# Altium schematic symbol library AD_Lib.SchLib: 1239 symbols (part 6 of 9) (continued)
## Q_PZTA44,115
designator Q?, comment PZTA44
Èý¼«¹Ü,NPN,0.3A,400V; Manufacturer: NXP; pro-environment: RoHS; Quality: -65~125¡æ; SN: 03.4.22.17.51TA4401S; OPN: PZTA44,115; PadsNum: 0; Value: NPN,0.3A,400V; Part: PZTA44; Category: Èý¼«¹Ü; QTY: 1000; Price: ?; OPN_JLC: OPN_JLC; SN_JLC: SN_JLC; Price_JLC: 0
footprint SOT223-4 (SOT223, 4-Leads, Body 6.5x3.5mm, Pitch 2.3mm, Lead Span 7mm, IPC Low Density)
pins: 1 B, 2 C, 3 E, 4 C

## Q_PZTA64
designator Q?, comment PZTA64
Èý¼«¹Ü,PNP,1.2A,30V; Manufacturer: Fairchild; pro-environment: RoHS; Quality: -55~150¡æ; PadsNum: 0; SN: SN; Value: PNP,1.2A,30V; OPN: PZTA64; Part: PZTA64; Category: Èý¼«¹Ü; QTY: 4000; Price: 0.79439; OPN_JLC: OPN_JLC; SN_JLC: SN_JLC; Price_JLC: 0
footprint SOT223-4 (SOT223, 4-Leads, Body 6.5x3.5mm, Pitch 2.3mm, Lead Span 7mm, IPC Low Density)
pins: 1 B, 2 C, 3 E, 4 C

## Q_PZTA92
designator Q?, comment PZTA92
Èý¼«¹Ü,PNP,0.5A,300V; Manufacturer: Fairchild; pro-environment: RoHS; Quality: -55~150¡æ; SN: 03.4.22.11.31PZTA01S; PadsNum: 0; Value: PNP,0.5A,300V; OPN: PZTA92; Part: PZTA92; Category: Èý¼«¹Ü; Price: ?; OPN_JLC: OPN_JLC; SN_JLC: SN_JLC; Price_JLC: 0
footprint SOT223-4 (SOT223, 4-Leads, Body 6.5x3.5mm, Pitch 2.3mm, Lead Span 7mm, IPC Low Density)
pins: 1 B, 2 C, 3 E, 4 C

## Q_SEMiX303GB12E4s
designator Q?, comment SEMiX303GB12E4s
IGBT; Manufacturer: SEMIKRON; pro-environment: RoHS; Quality: -40~175¡æ; Value: IGBT,1200V,359A; other: IGBT;Half bridge;1200V,359A; PadsNum: 0; SN: SN; OPN: SEMiX303GB12E4s; Part: SEMiX303GB12E4s; Category: Èý¼«¹Ü; QTY: 1; Price: -; OPN_JLC: OPN_JLC; SN_JLC: SN_JLC; Price_JLC: 0
footprint J_SEMiX303GB12E4s (Semikron°ëÇÅÄ£¿é)
part A pins: 2 C1, 3 E1, 7 E1, 8 B1, 11 E1, 12 B1, 15 E1, 16 B1, 18 C1
part B pins: 1 E2, 4 C2, 5 E2, 6 B2, 9 E2, 10 B2, 13 E2, 14 B2
part C pins: 19, 20
part C text: T

## Q_SI2323DS-T1-GE3
designator Q?, comment SI2323DS
MOS; PE; 4.7A; 20V; Manufacturer: Vishay; pro-environment: RoHS; Quality: -55~150¡æ; Value: PE,4.7A,20V; OPN: SI2323DS-T1-GE3; PadsNum: 0; SN: SN; Part: SI2323DS; Category: MOS¹Ü; QTY: 3000; Price: 2.3166; OPN_JLC: OPN_JLC; SN_JLC: SN_JLC; Price_JLC: 0
footprint SOT23-3 (SOT-23; 3 Leads; Body 3.0 x 2.5 mm, inc. leads (LxW max))
pins: 1 G, 2 S, 3 D
text: PE

## Q_SUD50P04-09L-E3
designator Q?, comment SUD50P04-09L
MOS; PE; 50A; 40V; Manufacturer: Vishay; pro-environment: RoHS; Quality: -55~175¡æ; SN: 03.4.24.21.33SUD501S; Value: PE,50A,40V; OPN: SUD50P04-09L-E3; PadsNum: 0; Category: MOS¹Ü; Part: SUD50P04-09L; QTY: 2000; Price: 7.4412; OPN_JLC: OPN_JLC; SN_JLC: SN_JLC; Price_JLC: 0
footprint TO252-3 (D-PAK, 4-Leads, Body 6.1x6.5mm, Pitch 2.28mm, Lead Span 9.8mm, IPC Low Density)
pins: 1 G, 3 S, 4 D
text: PE

## Q_TK8A50D(STA4,Q,M)
designator Q?, comment TK8A50D
MOS¹Ü;NE; Manufacturer: Toshiba; pro-environment: RoHS; Quality: -55~150¡æ; SN: 03.4.24.21.72TK8A01S; Value: NE,8A,500V; OPN: TK8A50D(STA4,Q,M); PadsNum: 0; Part: TK8A50D; Category: MOS¹Ü; QTY: 2500; Price: 4.9491; OPN_JLC: OPN_JLC; SN_JLC: SN_JLC; Price_JLC: 0
footprint TO220-3 (TO, Thru-Hole, Vertical, Heatsink Mounted; 3 In-Line Leads; Pitch 2.54 mm)
pins: 1 G, 2 D, 3 S
text: NE

## Q_TN2540N8-G
designator Q?, comment TN2540
MOS¹Ü£¬NE; Manufacturer: Microchip; pro-environment: RoHS; Quality: -55~150¡æ; SN: 03.4.24.21.53TN2501S; Value: NE,1A,400V; OPN: TN2540N8-G; PadsNum: 0; Part: TN2540; Category: MOS¹Ü; QTY: 2000; Price: ?; OPN_JLC: OPN_JLC; SN_JLC: SN_JLC; Price_JLC: 0
footprint SOT89-3 (SOT89, 3-Leads, Body 4.5x2.4 mm, Pitch 1.5mm, Lead Span 4.1mm, IPC Medium Density)
pins: 1 G, 2 D, 3 S
text: NE

## Q_TP2540N8-G
designator Q?, comment TP2540
MOS¹Ü£¬PE; Manufacturer: Microchip; pro-environment: RoHS; Quality: -55~150¡æ; SN: 03.4.24.21.53TP2501s; Value: PE,0.4A,400V; OPN: TP2540N8-G; PadsNum: 0; Part: TP2540; Category: MOS¹Ü; QTY: 2000; Price: ?; OPN_JLC: OPN_JLC; SN_JLC: SN_JLC; Price_JLC: 0
footprint SOT89-3 (SOT89, 3-Leads, Body 4.5x2.4 mm, Pitch 1.5mm, Lead Span 4.1mm, IPC Medium Density)
pins: 1 G, 2 D, 3 S
text: PE

## Q_TTD1409B
designator Q?, comment TTD1409B
´ïÁÖ¶Ù¹Ü£¬NPN; Manufacturer: TOSHIBA; Quality: -55~150¡æ; SN: 03.4.22.11.38140902S; Value: 6A,400V; PadsNum: 0; OPN: TTD1409B; Part: TTD1409B; Category: ´ïÁÖ¶Ù¹Ü; QTY: 1000; Price: ?; OPN_JLC: OPN_JLC; SN_JLC: SN_JLC; Price_JLC: 0
footprint TO220-3 (TO, Thru-Hole, Vertical, Heatsink Mounted; 3 In-Line Leads; Pitch 2.54 mm)
pins: 1 B, 2 C, 3 E

## Q_VP2450N3-G
designator Q?, comment VP2450
MOS¹Ü£¬PE; Manufacturer: Microchip; pro-environment: RoHS; Quality: -55~150¡æ; Value: PE,0.1A,500V; OPN: VP2450N3-G; PadsNum: 0; SN: SN; Part: VP2450; Category: MOS¹Ü; QTY: 1000; Price: ?; OPN_JLC: OPN_JLC; SN_JLC: SN_JLC; Price_JLC: 0
footprint SOT89-3 (SOT89, 3-Leads, Body 4.5x2.4 mm, Pitch 1.5mm, Lead Span 4.1mm, IPC Medium Density)
pins: 1 G, 2 D, 3 S
text: PE

## R0402_0/1kV
designator R?, comment 0¦¸
ÌùÆ¬µç×è; Manufacturer: KOA; pro-environment: RoHS; Quality: -55~155¡æ; OPN: RK73Z1ELTP; PadsNum: 2; SN: SN; other: 0¦¸; Category: µç×è; Part: RK73Z1ELTP; Value: 0¦¸; QTY: 10000; Price: 0.09944; OPN_JLC: OPN_JLC; SN_JLC: SN_JLC; Price_JLC: 0
footprint R0402 (ÌùÆ¬µç×è£¬¹¦ÂÊ1/24W)
pins: 1, 2

## R0402_1.5K/50V
designator R?, comment 1.5k¦¸,0.1W
ÌùÆ¬µç×è; Manufacturer: KOA; pro-environment: RoHS; Quality: -55~155¡æ; other: 1.5k¦¸;0.1W;1%; OPN: RK73H1ETTP1501F; PadsNum: 2; SN: SN; Category: µç×è; Part: RK73H1ETTP1501F; Value: 1.5k¦¸,0.1W; QTY: 10000; Price: 0.03051; OPN_JLC: OPN_JLC; SN_JLC: SN_JLC; Price_JLC: 0
footprint R0402 (ÌùÆ¬µç×è£¬¹¦ÂÊ1/24W)
pins: 1, 2

## R0402_1M/50V
designator R?, comment 1M¦¸,0.1W
ÌùÆ¬µç×è; Manufacturer: KOA; pro-environment: RoHS; Quality: -55~155¡æ; other: 1M¦¸;0.1W;1%; OPN: RK73H1ETTP1004F; PadsNum: 2; SN: SN; Category: µç×è; Part: RK73H1ETTP1004F; Value: 1M¦¸,0.1W; QTY: 10000; Price: 0.03051; OPN_JLC: OPN_JLC; SN_JLC: SN_JLC; Price_JLC: 0
footprint R0402 (ÌùÆ¬µç×è£¬¹¦ÂÊ1/24W)
pins: 1, 2

## R0402_2.49K/50V
designator R?, comment 2.49k¦¸,0.1W
ÌùÆ¬µç×è; Manufacturer: KOA; pro-environment: RoHS; Quality: -55~155¡æ; other: 2.49k¦¸;0.1W;1%; OPN: RK73H1ETTP2491F; PadsNum: 2; SN: SN; Category: µç×è; Part: RK73H1ETTP2491F; Value: 2.49k¦¸,0.1W; QTY: 10000; Price: 0.03051; OPN_JLC: OPN_JLC; SN_JLC: SN_JLC; Price_JLC: 0
footprint R0402 (ÌùÆ¬µç×è£¬¹¦ÂÊ1/24W)
pins: 1, 2

## R0402_3.92K/50V
designator R?, comment 3.92k¦¸,0.1W
ÌùÆ¬µç×è; Manufacturer: KOA; pro-environment: RoHS; Quality: -55~155¡æ; other: 3.92k¦¸;0.1W;1%; OPN: RK73H1ETTP3921F; PadsNum: 2; SN: SN; Category: µç×è; Part: RK73H1ETTP3921F; Value: 3.92k¦¸,0.1W; QTY: 10000; Price: 0.03051; OPN_JLC: OPN_JLC; SN_JLC: SN_JLC; Price_JLC: 0
footprint R0402 (ÌùÆ¬µç×è£¬¹¦ÂÊ1/24W)
pins: 1, 2

## R0402_4.7K/50V
designator R?, comment 4.7k¦¸,0.1W
ÌùÆ¬µç×è; Manufacturer: KOA; pro-environment: RoHS; Quality: -55~155¡æ; other: 4.7k¦¸;0.1W;1%; OPN: RK73H1ETTP4701F; PadsNum: 2; SN: SN; Category: µç×è; Part: RK73H1ETTP4701F; Value: 4.7k¦¸,0.1W; QTY: 10000; Price: 0.03051; OPN_JLC: OPN_JLC; SN_JLC: SN_JLC; Price_JLC: 0
footprint R0402 (ÌùÆ¬µç×è£¬¹¦ÂÊ1/24W)
pins: 1, 2

## R0402_10K/50V
designator R?, comment 10k¦¸,0.1W
ÌùÆ¬µç×è; Manufacturer: KOA; pro-environment: RoHS; Quality: -55~155¡æ; other: 10k¦¸;0.1W;1%; OPN: RK73H1ETTP1002F; PadsNum: 2; SN: SN; Category: µç×è; Part: RK73H1ETTP1002F; Value: 10k¦¸,0.1W; QTY: 10000; Price: 0.03051; OPN_JLC: OPN_JLC; SN_JLC: SN_JLC; Price_JLC: 0
footprint R0402 (ÌùÆ¬µç×è£¬¹¦ÂÊ1/24W)
pins: 1, 2

## R0402_10K/50V_1
designator R32, comment NC
ÌùÆ¬µç×è; Manufacturer: KOA; pro-environment: RoHS; Quality: -55~155¡æ; other: 10k¦¸;0.1W;1%; OPN: RK73H1ETTP1002F; SN: SN; Category: µç×è; Part: RK73H1ETTP1002F; Value: NC; QTY: 10000; Price: 0.03051; OPN_JLC: OPN_JLC; SN_JLC: SN_JLC
footprint 0402A
pins: 1, 2

## R0402_10K/50V_2
designator R36, comment NC
ÌùÆ¬µç×è; Manufacturer: KOA; pro-environment: RoHS; Quality: -55~155¡æ; other: 10k¦¸;0.1W;1%; OPN: RK73H1ETTP1002F; SN: SN; Category: µç×è; Part: RK73H1ETTP1002F; Value: NC; QTY: 10000; Price: 0.03051; OPN_JLC: OPN_JLC; SN_JLC: SN_JLC
footprint 0402A
pins: 1, 2

## R0402_10K/50V_3
designator R38, comment NC
ÌùÆ¬µç×è; Manufacturer: KOA; pro-environment: RoHS; Quality: -55~155¡æ; other: 10k¦¸;0.1W;1%; OPN: RK73H1ETTP1002F; SN: SN; Category: µç×è; Part: RK73H1ETTP1002F; Value: NC; QTY: 10000; Price: 0.03051; OPN_JLC: OPN_JLC; SN_JLC: SN_JLC
footprint 0402A
pins: 1, 2

## R0402_10K/50V_4
designator R43, comment NC
ÌùÆ¬µç×è; Manufacturer: KOA; pro-environment: RoHS; Quality: -55~155¡æ; other: 10k¦¸;0.1W;1%; OPN: RK73H1ETTP1002F; SN: SN; Category: µç×è; Part: RK73H1ETTP1002F; Value: NC; QTY: 10000; Price: 0.03051; OPN_JLC: OPN_JLC; SN_JLC: SN_JLC
footprint 0402A
pins: 1, 2

## R0402_10K/50V_5
designator R32, comment NC
ÌùÆ¬µç×è; Manufacturer: KOA; pro-environment: RoHS; Quality: -55~155¡æ; other: 10k¦¸;0.1W;1%; OPN: RK73H1ETTP1002F; SN: SN; Category: µç×è; Part: RK73H1ETTP1002F; Value: NC; QTY: 10000; Price: 0.03051; OPN_JLC: OPN_JLC; SN_JLC: SN_JLC
footprint 0402A
pins: 1, 2

## R0402_10K/50V_6
designator R36, comment NC
ÌùÆ¬µç×è; Manufacturer: KOA; pro-environment: RoHS; Quality: -55~155¡æ; other: 10k¦¸;0.1W;1%; OPN: RK73H1ETTP1002F; SN: SN; Category: µç×è; Part: RK73H1ETTP1002F; Value: NC; QTY: 10000; Price: 0.03051; OPN_JLC: OPN_JLC; SN_JLC: SN_JLC
footprint 0402A
pins: 1, 2

## R0402_10K/50V_7
designator R38, comment NC
ÌùÆ¬µç×è; Manufacturer: KOA; pro-environment: RoHS; Quality: -55~155¡æ; other: 10k¦¸;0.1W;1%; OPN: RK73H1ETTP1002F; SN: SN; Category: µç×è; Part: RK73H1ETTP1002F; Value: NC; QTY: 10000; Price: 0.03051; OPN_JLC: OPN_JLC; SN_JLC: SN_JLC
footprint 0402A
pins: 1, 2

## R0402_10K/50V_8
designator R43, comment NC
ÌùÆ¬µç×è; Manufacturer: KOA; pro-environment: RoHS; Quality: -55~155¡æ; other: 10k¦¸;0.1W;1%; OPN: RK73H1ETTP1002F; SN: SN; Category: µç×è; Part: RK73H1ETTP1002F; Value: NC; QTY: 10000; Price: 0.03051; OPN_JLC: OPN_JLC; SN_JLC: SN_JLC
footprint 0402A
pins: 1, 2

## R0402_13/50V
designator R?, comment 13¦¸,0.1W
ÌùÆ¬µç×è; Manufacturer: KOA; pro-environment: RoHS; Quality: -55~155¡æ; other: 13¦¸;0.1W;1%; OPN: RK73H1ETTP13R0F; PadsNum: 2; SN: SN; Category: µç×è; Part: RK73H1ETTP13R0F; Value: 13¦¸,0.1W; QTY: 10000; Price: 0.03051; OPN_JLC: OPN_JLC; SN_JLC: SN_JLC; Price_JLC: 0
footprint R0402 (ÌùÆ¬µç×è£¬¹¦ÂÊ1/24W)
pins: 1, 2

## R0402_15K/50V
designator R?, comment 15k¦¸,0.1W
ÌùÆ¬µç×è; Manufacturer: KOA; pro-environment: RoHS; Quality: -55~155¡æ; other: 15k¦¸;0.1W;1%; OPN: RK73H1ETTP1502F; PadsNum: 2; SN: SN; Category: µç×è; Part: RK73H1ETTP1502F; Value: 15k¦¸,0.1W; QTY: 10000; Price: 0.03051; OPN_JLC: OPN_JLC; SN_JLC: SN_JLC; Price_JLC: 0
footprint R0402 (ÌùÆ¬µç×è£¬¹¦ÂÊ1/24W)
pins: 1, 2

## R0402_26.1K/50V
designator R?, comment 26.1k¦¸,0.1W
ÌùÆ¬µç×è; Manufacturer: KOA; pro-environment: RoHS; Quality: -55~155¡æ; other: 26.1k¦¸;0.1W;1%; OPN: RK73H1ETTP2612F; PadsNum: 2; SN: SN; Category: µç×è; Part: RK73H1ETTP2612F; Value: 26.1k¦¸,0.1W; QTY: 10000; Price: 0.03051; OPN_JLC: OPN_JLC; SN_JLC: SN_JLC; Price_JLC: 0
footprint R0402 (ÌùÆ¬µç×è£¬¹¦ÂÊ1/24W)
pins: 1, 2

## R0402_47K/50V
designator R?, comment 47k¦¸,0.1W
ÌùÆ¬µç×è; Manufacturer: KOA; pro-environment: RoHS; Quality: -55~155¡æ; other: 47k¦¸;0.1W;1%; OPN: RK73H1ETTP4702F; PadsNum: 2; SN: SN; Category: µç×è; Part: RK73H1ETTP4702F; Value: 47k¦¸,0.1W; QTY: 10000; Price: 0.03051; OPN_JLC: OPN_JLC; SN_JLC: SN_JLC; Price_JLC: 0
footprint R0402 (ÌùÆ¬µç×è£¬¹¦ÂÊ1/24W)
pins: 1, 2

## R0402_56.2/50V
designator R?, comment 56.2¦¸,0.1W
ÌùÆ¬µç×è; Manufacturer: KOA; pro-environment: RoHS; Quality: -55~155¡æ; other: 56.2¦¸;0.1W;1%; OPN: RK73H1ETTP56R2F; PadsNum: 2; SN: SN; Category: µç×è; Part: RK73H1ETTP56R2F; Value: 56.2¦¸,0.1W; QTY: 10000; Price: 0.03051; OPN_JLC: OPN_JLC; SN_JLC: SN_JLC; Price_JLC: 0
footprint R0402 (ÌùÆ¬µç×è£¬¹¦ÂÊ1/24W)
pins: 1, 2

## R0402_95.3K/50V
designator R?, comment 95.3k¦¸,0.1W
ÌùÆ¬µç×è; Manufacturer: KOA; pro-environment: RoHS; Quality: -55~155¡æ; other: 95.3k¦¸;0.1W;1%; OPN: RK73H1ETTP9532F; PadsNum: 2; SN: SN; Category: µç×è; Part: RK73H1ETTP9532F; Value: 95.3k¦¸,0.1W; QTY: 10000; Price: 0.03051; OPN_JLC: OPN_JLC; SN_JLC: SN_JLC; Price_JLC: 0
footprint R0402 (ÌùÆ¬µç×è£¬¹¦ÂÊ1/24W)
pins: 1, 2

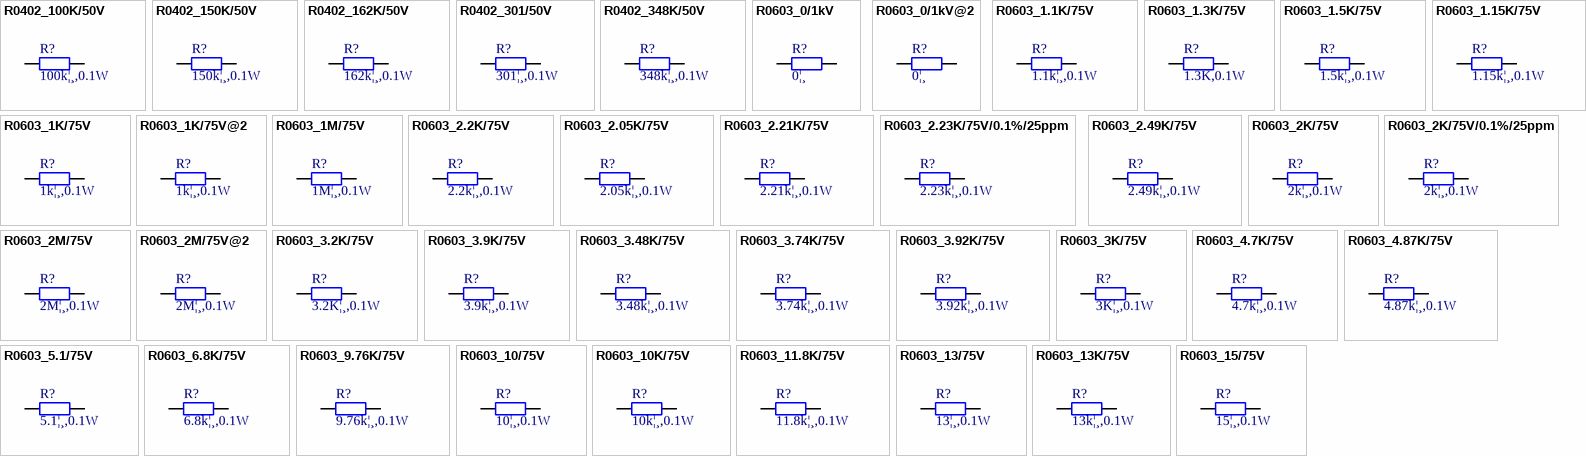
[diagram p29: symbols R0402_100K/50V to R0603_15/75V]

## R0402_100K/50V
designator R?, comment 100k¦¸,0.1W
ÌùÆ¬µç×è; Manufacturer: KOA; pro-environment: RoHS; Quality: -55~155¡æ; other: 100k¦¸;0.1W;1%; OPN: RK73H1ETTP1003F; PadsNum: 2; SN: SN; Category: µç×è; Part: RK73H1ETTP1003F; Value: 100k¦¸,0.1W; QTY: 10000; Price: 0.03051; OPN_JLC: OPN_JLC; SN_JLC: SN_JLC; Price_JLC: 0
footprint R0402 (ÌùÆ¬µç×è£¬¹¦ÂÊ1/24W)
pins: 1, 2

## R0402_150K/50V
designator R?, comment 150k¦¸,0.1W
ÌùÆ¬µç×è; Manufacturer: KOA; pro-environment: RoHS; Quality: -55~155¡æ; other: 150k¦¸;0.1W;1%; OPN: RK73H1ETTP1503F; PadsNum: 2; SN: SN; Category: µç×è; Part: RK73H1ETTP1503F; Value: 150k¦¸,0.1W; QTY: 10000; Price: 0.03051; OPN_JLC: OPN_JLC; SN_JLC: SN_JLC; Price_JLC: 0
footprint R0402 (ÌùÆ¬µç×è£¬¹¦ÂÊ1/24W)
pins: 1, 2

## R0402_162K/50V
designator R?, comment 162k¦¸,0.1W
ÌùÆ¬µç×è; Manufacturer: KOA; pro-environment: RoHS; Quality: -55~155¡æ; other: 162k¦¸;0.1W;1%; OPN: RK73H1ETTP1623F; PadsNum: 2; SN: SN; Category: µç×è; Part: RK73H1ETTP1623F; Value: 162k¦¸,0.1W; QTY: 10000; Price: 0.03051; OPN_JLC: OPN_JLC; SN_JLC: SN_JLC; Price_JLC: 0
footprint R0402 (ÌùÆ¬µç×è£¬¹¦ÂÊ1/24W)
pins: 1, 2

## R0402_301/50V
designator R?, comment 301¦¸,0.1W
ÌùÆ¬µç×è; Manufacturer: KOA; pro-environment: RoHS; Quality: -55~155¡æ; other: 301¦¸;0.1W;1%; OPN: RK73H1ETTP3010F; PadsNum: 2; SN: SN; Category: µç×è; Part: RK73H1ETTP3010F; Value: 301¦¸,0.1W; QTY: 10000; Price: 0.03051; OPN_JLC: OPN_JLC; SN_JLC: SN_JLC; Price_JLC: 0
footprint R0402 (ÌùÆ¬µç×è£¬¹¦ÂÊ1/24W)
pins: 1, 2

## R0402_348K/50V
designator R?, comment 348k¦¸,0.1W
ÌùÆ¬µç×è; Manufacturer: KOA; pro-environment: RoHS; Quality: -55~155¡æ; other: 348k¦¸;0.1W;1%; OPN: RK73H1ETTP3483F; PadsNum: 2; SN: SN; Category: µç×è; Part: RK73H1ETTP3483F; Value: 348k¦¸,0.1W; QTY: 10000; Price: 0.03051; OPN_JLC: OPN_JLC; SN_JLC: SN_JLC; Price_JLC: 0
footprint R0402 (ÌùÆ¬µç×è£¬¹¦ÂÊ1/24W)
pins: 1, 2

## R0603_0/1kV
designator R?, comment 0¦¸
ÌùÆ¬µç×è; Manufacturer: KOA; pro-environment: RoHS; Quality: -55~155¡æ; SN: 03.4.38.11.16000001S; OPN: RK73Z1JTTD; PadsNum: 2; other: 0¦¸; Category: µç×è; Part: RK73Z1JTTD; Value: 0¦¸; QTY: 5000; Price: ?; OPN_JLC: 0603WAF0000T5E; SN_JLC: C21189; Price_JLC: 0
footprint R0603 (ÌùÆ¬µç×è£¬¹¦ÂÊ1/10W)
pins: 1, 2

## R0603_0/1kV@2
designator R?, comment 0¦¸
ÌùÆ¬µç×è; Manufacturer: Panasonic; pro-environment: RoHS; Quality: -55~155¡æ; OPN: ERJ-3GEY0R00V; PadsNum: 2; SN: SN; other: 0¦¸; Category: µç×è; Part: ERJ-3GEY0R00V; Value: 0¦¸; Price: ?; OPN_JLC: 0603WAF0000T5E; SN_JLC: C21189; Price_JLC: 0
footprint R0603 (ÌùÆ¬µç×è£¬¹¦ÂÊ1/10W)
pins: 1, 2

## R0603_1.1K/75V
designator R?, comment 1.1k¦¸,0.1W
ÌùÆ¬µç×è; Manufacturer: KOA; pro-environment: RoHS; Quality: -55~155¡æ; SN: 03.4.38.11.16011201S; other: 1.1k¦¸,0.1W,1%,75V; OPN: RK73H1JTTD1101F; PadsNum: 2; Category: µç×è; Part: RK73H1JTTD1101F; Value: 1.1k¦¸,0.1W; Price: ?; OPN_JLC: 0603WAF1101T5E; SN_JLC: C22764; Price_JLC: 0
footprint R0603 (ÌùÆ¬µç×è£¬¹¦ÂÊ1/10W)
pins: 1, 2

## R0603_1.3K/75V
designator R?, comment 1.3K,0.1W
ÌùÆ¬µç×è; Manufacturer: KOA; pro-environment: RoHS; Quality: -55~155¡æ; other: 1.3K,0.1W,1%,75V; OPN: RK73H1JTTD1301F; PadsNum: 2; SN: SN; Category: µç×è; Part: RK73H1JTTD1301F; Value: 1.3K,0.1W; QTY: 5000; OPN_JLC: OPN_JLC; SN_JLC: SN_JLC; Price_JLC: 0
footprint R0603 (ÌùÆ¬µç×è£¬¹¦ÂÊ1/10W)
pins: 1, 2

## R0603_1.5K/75V
designator R?, comment 1.5k¦¸,0.1W
ÌùÆ¬µç×è; Manufacturer: KOA; pro-environment: RoHS; Quality: -55~155¡æ; SN: 03.4.38.11.16015202S; other: 1.5k¦¸,0.1W,1%,75V; OPN: RK73H1JTTD1501F; PadsNum: 2; Category: µç×è; Part: RK73H1JTTD1501F; Value: 1.5k¦¸,0.1W; QTY: 5000; Price: 0.0234; OPN_JLC: 0603WAF1501T5E; SN_JLC: C22843; Price_JLC: 0
footprint R0603 (ÌùÆ¬µç×è£¬¹¦ÂÊ1/10W)
pins: 1, 2

## R0603_1.15K/75V
designator R?, comment 1.15k¦¸,0.1W
ÌùÆ¬µç×è; Manufacturer: KOA; pro-environment: RoHS; Quality: -55~155¡æ; other: 1.15k¦¸,0.1W,1%,75V; OPN: RK73H1JTTD1151F; PadsNum: 2; SN: SN; Category: µç×è; Part: RK73H1JTTD1151F; Value: 1.15k¦¸,0.1W; QTY: 5000; Price: 0.0234; OPN_JLC: OPN_JLC; SN_JLC: SN_JLC; Price_JLC: 0
footprint R0603 (ÌùÆ¬µç×è£¬¹¦ÂÊ1/10W)
pins: 1, 2

## R0603_1K/75V
designator R?, comment 1k¦¸,0.1W
ÌùÆ¬µç×è; Manufacturer: KOA; pro-environment: RoHS; Quality: -55~155¡æ; SN: 03.4.38.11.16010203S; other: 1k¦¸,0.1W,1%,75V; OPN: RK73H1JTTD1001F; PadsNum: 2; Category: µç×è; Part: RK73H1JTTD1001F; Value: 1k¦¸,0.1W; QTY: 5000; Price: ?; OPN_JLC: 0603WAF1001T5E; SN_JLC: C21190; Price_JLC: 0
footprint R0603 (ÌùÆ¬µç×è£¬¹¦ÂÊ1/10W)
pins: 1, 2

## R0603_1K/75V@2
designator R?, comment 1k¦¸,0.1W
ÌùÆ¬µç×è; Manufacturer: Panasonic; pro-environment: RoHS; Quality: -55~155¡æ; SN: 03.4.38.11.16010201S; other: 1k¦¸,0.1W,1%,75V; OPN: ERJ3GEYJ102V; PadsNum: 2; Category: µç×è; Part: ERJ3GEYJ102V; Value: 1k¦¸,0.1W; Price: ?; OPN_JLC: 0603WAF1001T5E; SN_JLC: C21190; Price_JLC: 0
footprint R0603 (ÌùÆ¬µç×è£¬¹¦ÂÊ1/10W)
pins: 1, 2

## R0603_1M/75V
designator R?, comment 1M¦¸,0.1W
ÌùÆ¬µç×è; Manufacturer: Yageo; pro-environment: RoHS; Quality: -55~155¡æ; SN: 03.4.38.11.16010501S; other: 1M¦¸,0.1W,1%,75V; OPN: RC0603FR-071ML; PadsNum: 2; Category: µç×è; Part: RC0603FR-071ML; Value: 1M¦¸,0.1W; QTY: 5000; Price: ?; OPN_JLC: 0603WAF1004T5E; SN_JLC: C22935; Price_JLC: 0
footprint R0603 (ÌùÆ¬µç×è£¬¹¦ÂÊ1/10W)
pins: 1, 2

## R0603_2.2K/75V
designator R?, comment 2.2k¦¸,0.1W
ÌùÆ¬µç×è; Manufacturer: KOA; pro-environment: RoHS; Quality: -55~155¡æ; other: 2.2k¦¸,0.1W,1%,75V; OPN: RK73H1JTTD2201F; PadsNum: 2; SN: SN; Category: µç×è; Part: RK73H1JTTD2201F; Value: 2.2k¦¸,0.1W; QTY: 5000; Price: -; OPN_JLC: RC0603FR-072K2L; SN_JLC: C114662; Price_JLC: 0.009713
footprint R0603 (ÌùÆ¬µç×è£¬¹¦ÂÊ1/10W)
pins: 1, 2

## R0603_2.05K/75V
designator R?, comment 2.05k¦¸,0.1W
ÌùÆ¬µç×è; Manufacturer: KOA; pro-environment: RoHS; Quality: -55~155¡æ; other: 2.05k¦¸,0.1W,1%,75V; OPN: RK73H1JTTD2051F; PadsNum: 2; SN: SN; Category: µç×è; Part: RK73H1JTTD2051F; Value: 2.05k¦¸,0.1W; Price: ?; OPN_JLC: OPN_JLC; SN_JLC: SN_JLC; Price_JLC: 0
footprint R0603 (ÌùÆ¬µç×è£¬¹¦ÂÊ1/10W)
pins: 1, 2

## R0603_2.21K/75V
designator R?, comment 2.21k¦¸,0.1W
ÌùÆ¬µç×è; Manufacturer: KOA; pro-environment: RoHS; Quality: -55~155¡æ; other: 2.21k¦¸,0.1W,1%,75V; OPN: RK73H2ATTD2211F; PadsNum: 2; SN: SN; Category: µç×è; Part: RK73H2ATTD2211F; Value: 2.21k¦¸,0.1W; Price: ?; OPN_JLC: OPN_JLC; SN_JLC: SN_JLC; Price_JLC: 0
footprint R0603 (ÌùÆ¬µç×è£¬¹¦ÂÊ1/10W)
pins: 1, 2

## R0603_2.23K/75V/0.1%/25ppm
designator R?, comment 2.23k¦¸,0.1W
¾«ÃÜµç×è£¬0.1%£¬25ppm; Manufacturer: KOA; pro-environment: RoHS; Quality: -55~155¡æ; other: 2.23k¦¸,0.1W,0.1%,75V,25ppm; OPN: RN73H1JTTD2231B25; PadsNum: 2; SN: SN; Category: µç×è; Part: RN73H1JTTD2231B25; Value: 2.23k¦¸,0.1W; QTY: 5000; Price: 1.9656; OPN_JLC: OPN_JLC; SN_JLC: SN_JLC; Price_JLC: 0
footprint R0603 (ÌùÆ¬µç×è£¬¹¦ÂÊ1/10W)
pins: 1, 2

## R0603_2.49K/75V
designator R?, comment 2.49k¦¸,0.1W
ÌùÆ¬µç×è; Manufacturer: Yageo; pro-environment: RoHS; Quality: -55~155¡æ; other: 2.49k¦¸,0.1W,1%,75V; OPN: RC0603FR-0749K9L; PadsNum: 2; SN: SN; Category: µç×è; Part: RC0603FR-0749K9L; Value: 2.49k¦¸,0.1W; QTY: 5000; Price: 0.006069; OPN_JLC: RC0603FR-0749K9L; SN_JLC: C114624; Price_JLC: 0.006069
footprint R0603 (ÌùÆ¬µç×è£¬¹¦ÂÊ1/10W)
pins: 1, 2

## R0603_2K/75V
designator R?, comment 2k¦¸,0.1W
ÌùÆ¬µç×è; Manufacturer: KOA; pro-environment: RoHS; Quality: -55~155¡æ; SN: 03.4.38.11.16020203S; other: 2k¦¸,0.1W,1%,50V; OPN: RK73H1JTTD2001F; PadsNum: 2; Category: µç×è; Part: RK73H1JTTD2001F; Value: 2k¦¸,0.1W; QTY: 5000; Price: 0.02457; OPN_JLC: 0603WAF2001T5E; SN_JLC: C22975; Price_JLC: 0
footprint R0603 (ÌùÆ¬µç×è£¬¹¦ÂÊ1/10W)
pins: 1, 2

## R0603_2K/75V/0.1%/25ppm
designator R?, comment 2k¦¸,0.1W
¾«ÃÜµç×è£¬0.1%£¬25ppm; Manufacturer: KOA; pro-environment: RoHS; Quality: -55~155¡æ; SN: 03.4.38.27.16120201S; other: 2k¦¸,0.125W,0.1%,75V,25ppm; OPN: RN73H1JTTD2001B25; PadsNum: 2; Category: µç×è; Part: RN73H1JTTD2001B25; Value: 2k¦¸,0.1W; QTY: 5000; Price: 1.6497; OPN_JLC: 0603WAF2001T5E; SN_JLC: C22975; Price_JLC: 0
footprint R0603 (ÌùÆ¬µç×è£¬¹¦ÂÊ1/10W)
pins: 1, 2

## R0603_2M/75V
designator R?, comment 2M¦¸,0.1W
ÌùÆ¬µç×è; Manufacturer: KOA; pro-environment: RoHS; Quality: -55~155¡æ; SN: 03.4.38.11.16020502S; other: 2M¦¸,0.1W,1%,75V; OPN: RK73H1JTTD2004F; PadsNum: 2; Category: µç×è; Part: RK73H1JTTD2004F; Value: 2M¦¸,0.1W; QTY: 5000; Price: 0.0234; OPN_JLC: 0603WAF2004T5E; SN_JLC: C22976; Price_JLC: 0
footprint R0603 (ÌùÆ¬µç×è£¬¹¦ÂÊ1/10W)
pins: 1, 2

## R0603_2M/75V@2
designator R?, comment 2M¦¸,0.1W
ÌùÆ¬µç×è; Manufacturer: Panasonic; pro-environment: RoHS; Quality: -55~155¡æ; other: 2M¦¸,0.1W,1%,75V; OPN: ERJ-3EKF2004V; PadsNum: 2; SN: SN; Category: µç×è; Part: ERJ-3EKF2004V; Value: 2M¦¸,0.1W; Price: ?; OPN_JLC: 0603WAF2004T5E; SN_JLC: C22976; Price_JLC: 0
footprint R0603 (ÌùÆ¬µç×è£¬¹¦ÂÊ1/10W)
pins: 1, 2

## R0603_3.2K/75V
designator R?, comment 3.2K¦¸,0.1W
ÌùÆ¬µç×è; Manufacturer: KOA; pro-environment: RoHS; Quality: -55~155¡æ; other: 3.2K¦¸,0.1W,1%,75V; OPN: RK73H1JTTD3241F; PadsNum: 2; SN: SN; Category: µç×è; Part: RK73H1JTTD3241F; Value: 3.2K¦¸,0.1W; QTY: 5000; Price: 0.02457; OPN_JLC: OPN_JLC; SN_JLC: SN_JLC; Price_JLC: 0
footprint R0603 (ÌùÆ¬µç×è£¬¹¦ÂÊ1/10W)
pins: 1, 2

## R0603_3.9K/75V
designator R?, comment 3.9k¦¸,0.1W
ÌùÆ¬µç×è; Manufacturer: KOA; pro-environment: RoHS; Quality: -55~155¡æ; SN: 03.4.38.11.16039202S; other: 3.9k¦¸,0.1W,1%,75V; OPN: RK73H1JTTD3901F; PadsNum: 2; Category: µç×è; Part: RK73H1JTTD3901F; Value: 3.9k¦¸,0.1W; QTY: 5000; Price: ?; OPN_JLC: 0603WAF3901T5E; SN_JLC: C23018; Price_JLC: 0
footprint R0603 (ÌùÆ¬µç×è£¬¹¦ÂÊ1/10W)
pins: 1, 2

## R0603_3.48K/75V
designator R?, comment 3.48k¦¸,0.1W
ÌùÆ¬µç×è; Manufacturer: KOA; pro-environment: RoHS; Quality: -55~155¡æ; other: 3.48k¦¸,0.1W,1%,75V; OPN: RK73H1JTTD3481F; PadsNum: 2; SN: SN; Category: µç×è; Part: RK73H1JTTD3481F; Value: 3.48k¦¸,0.1W; QTY: 5000; Price: ?; OPN_JLC: OPN_JLC; SN_JLC: SN_JLC; Price_JLC: 0
footprint R0603 (ÌùÆ¬µç×è£¬¹¦ÂÊ1/10W)
pins: 1, 2